# Altium footprint library MyPcb.PcbLib: 367 footprints (part 23 of 23)
Each footprint in its own frame and in the unit in brackets; x right, y up, seen from the top. Pads: shape width x height; smd on the part's side, far side on the other; paste and mask are expansions set on the pad; w line width, h text height; cw(c..) or ccw(c..) is an arc to the next point about the centre after c.
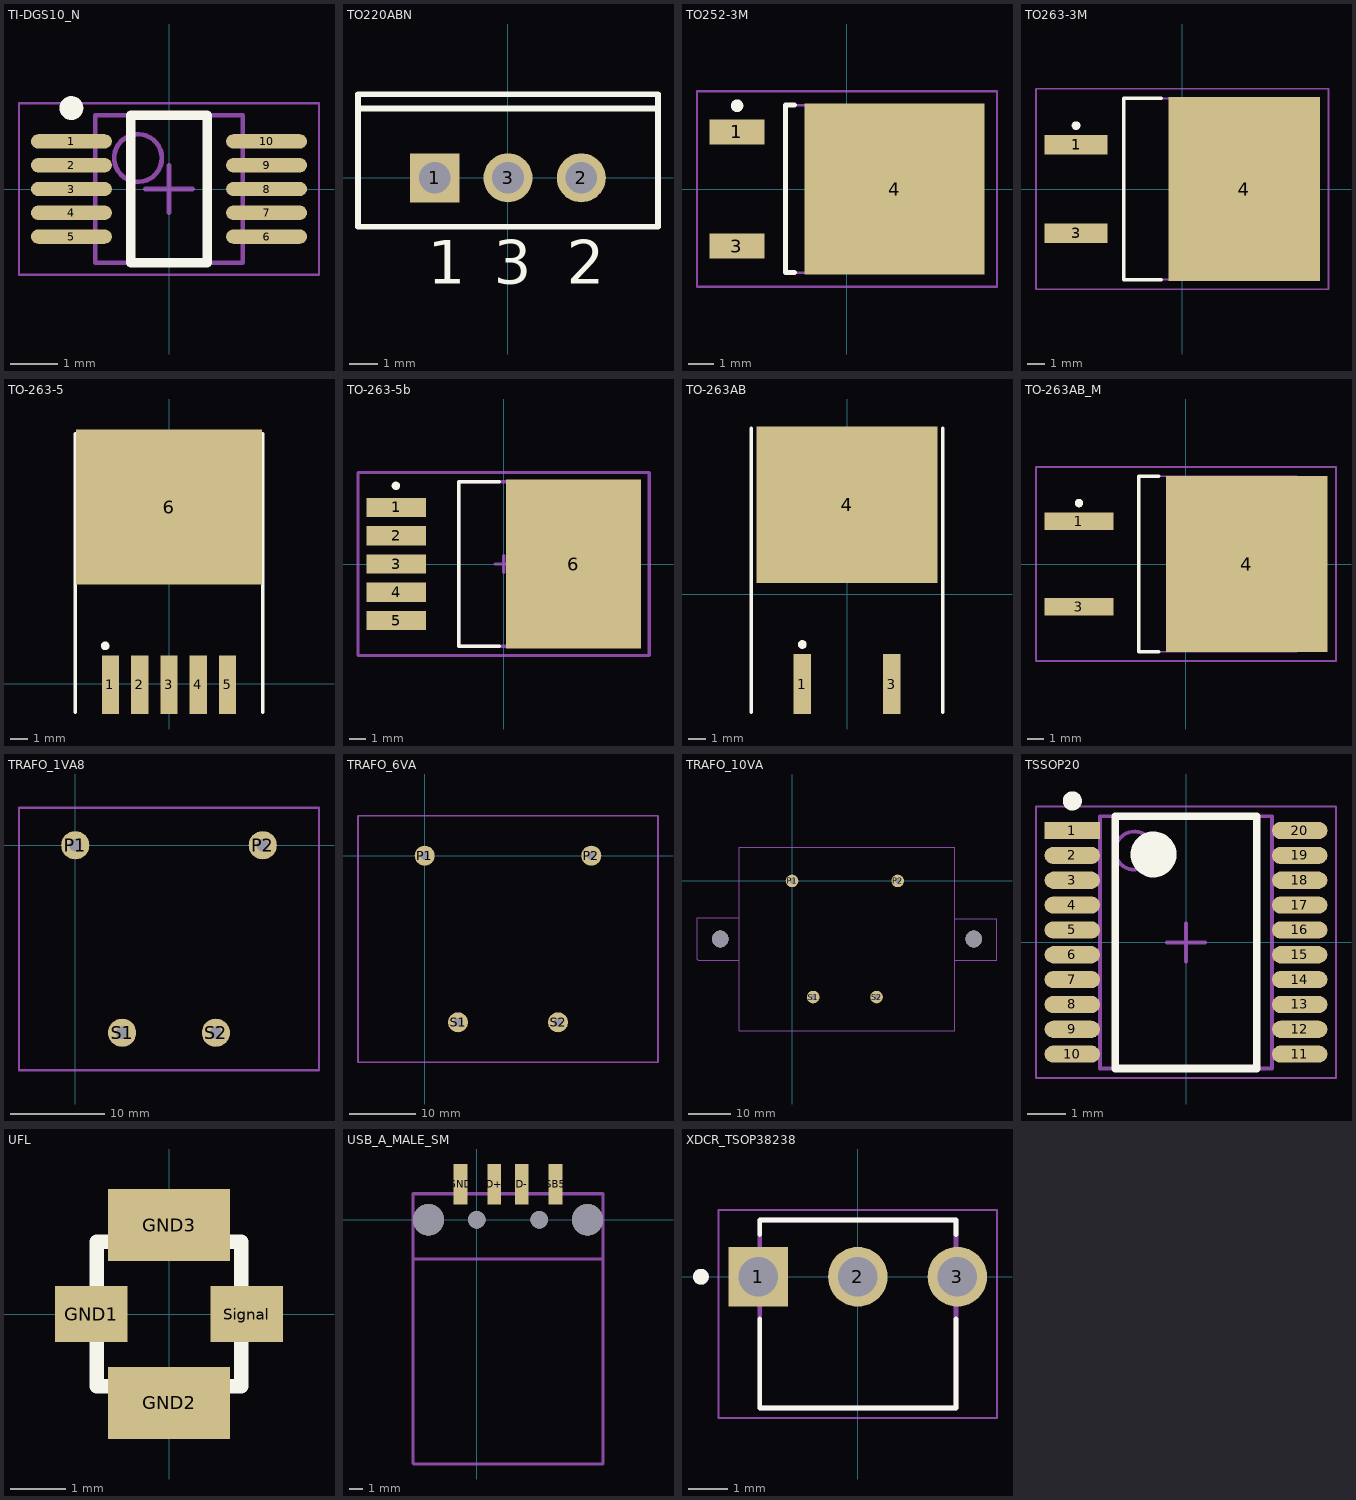
[diagram p22: the footprints below, top view; thin cyan lines are the x and y axes]

## TI-DGS10_N [mm] "SOP, 10-Leads, Body 3x3mm, Pitch 0.5mm, IPC Medium Density"
height 1.1
pads (10):
  oval 1.7x0.3 smd: 1(-2.05,1) 2(-2.05,0.5) 3(-2.05,0) 4(-2.05,-0.5) 5(-2.05,-1) 6(2.05,-1) 7(2.05,-0.5) 8(2.05,0) 9(2.05,0.5) 10(2.05,1)
Top Overlay:
  circle w0.25: c-2.05,1.7 r0.125
  lines w0.2: -0.8,-1.55 0.8,-1.55 0.8,1.55 -0.8,1.55 -0.8,-1.55
Mechanical 13:
  circle w0.1: c-0.65,0.65 r0.5
  lines w0.1: -1.55,-1.55 1.55,-1.55 1.55,1.55 -1.55,1.55 -1.55,-1.55
Mechanical 15:
  lines w0.05: -3.15,-1.8 3.15,-1.8 3.15,1.8 -3.15,1.8 -3.15,-1.8
  lines w0.1: -0.5,0 0.5,0 ; 0,-0.5 0,0.5
3D body: height 1.1, standoff 0.05, extent -1.55,-1.55 1.55,1.55

## TO220ABN [mm] "TO, Thru-Hole, Vertical, Heatsink Mounted; 3 In-Line Leads; Pitch 2.54 mm; Pin sequence 1, 3, 2"
height 19.7
pads (3):
  rect 1.7x1.7 hole 1.1: 1(-2.54,0)
  round 1.7 hole 1.1: 2(2.54,0) 3(0,0)
Top Overlay:
  lines w0.2: -5.2,2.4 5.2,2.4 ; -5.2,-1.7 5.2,-1.7 5.2,2.9 -5.2,2.9 -5.2,-1.7
  text "3" at -0.5,-3.675 h1.5
  text "2" at 2.04,-3.675 h1.5
  text "1" at -2.79,-3.675 h1.5

## TO252-3M [mm] "D-PAK, 4-Leads, Body 6.1x6.5mm, Pitch 2.28mm, Lead Span 9.7mm, IPC Low Density"
height 2.38
pads (3):
  rect 2.2x1 smd: 1(-4.4,2.28) 3(-4.4,-2.28)
  rect 7.2x6.85 smd: 4(1.9,0)
Top Overlay:
  circle w0.25: c-4.4,3.33 r0.125
  lines w0.2: -2.1,-3.35 -2.45,-3.35 -2.45,3.35 -2.1,3.35
Mechanical 13:
  lines w0.1: -2.45,-3.35 3.75,-3.35 3.75,3.35 -2.45,3.35 -2.45,-3.35
Mechanical 15:
  lines w0.1: -0.5,0 0.5,0 ; 0,-0.5 0,0.5 ; -6,-3.9 6,-3.9 6,3.9 -6,3.9 -6,-3.9
3D body: height 2.38, standoff 0, extent -2.45,-3.35 3.75,3.35

## TO263-3M [mm] "D2-PAK, 4-Leads, Body 9.4x10.2mm, Pitch 2.54mm, Lead Span 14.3mm, IPC Low Density"
height 4.65
pads (3):
  rect 3.6x1.1 smd: 1(-6.1,2.54) 3(-6.1,-2.54)
  rect 8.7x10.55 smd: 4(3.55,0)
Top Overlay:
  circle w0.25: c-6.1,3.64 r0.125
  lines w0.2: -1.2,-5.2 -3.35,-5.2 -3.35,5.2 -1.2,5.2
Mechanical 13:
  lines w0.1: -3.35,-5.2 -3.35,5.2 6.05,5.2 6.05,-5.2 -3.35,-5.2
Mechanical 15:
  lines w0.1: -0.5,0 0.5,0 ; 0,-0.5 0,0.5 ; -8.4,-5.75 -8.4,5.75 8.4,5.75 8.4,-5.75 -8.4,-5.75
3D body: height 4.65, standoff 0, extent -3.35,-5.2 6.05,5.2

## TO-263-5 [mm] "D2-PAK/TO-263-AB; 3 Leads (1 Cropped); Body 15.6 (inc. leads) x 10.3 mm (LxW max)"
height 4.57
pads (6):
  rect 1x3.4 smd: 1(-3.4,-0.05) 2(-1.7,-0.05) 3(0,-0.05) 4(1.7,-0.05) 5(3.4,-0.05)
  rect 10.8x9 smd: 6(0,10.25)
Top Overlay:
  circle w0.25: c-3.7,2.2 r0.125
  lines w0.2: -5.45,-1.65 -5.45,14.5 ; 5.45,-1.65 5.45,14.5

## TO-263-5b [mm] "D2-PAK, 6-Pads, Body 8,9x9,9mm (max), IPC Low Density"
height 4.65
pads (6):
  rect 3.6x1.15 smd: 1(-6.45,3.4) 2(-6.45,1.7) 3(-6.45,0) 4(-6.45,-1.7) 5(-6.45,-3.4)
  rect 8.1x10.15 smd paste-5: 6(4.2,0)
Top Overlay:
  circle w0.25: c-6.475,4.699 r0.125
  lines w0.2: -0.25,-4.95 -2.7,-4.95 -2.7,4.95 -0.25,4.95
Top Paste:
  rectangle: 0.254,3.683 2.159,4.953
  rectangle: 6.223,3.683 8.128,4.953
  rectangle: 2.667,3.683 5.715,4.953
  rectangle: 2.667,1.956 5.715,3.226
  rectangle: 6.223,1.956 8.128,3.226
  rectangle: 0.254,1.956 2.159,3.226
  rectangle: 2.667,0.229 5.715,1.499
  rectangle: 6.223,0.229 8.128,1.499
  rectangle: 0.254,0.229 2.159,1.499
  rectangle: 2.667,-1.499 5.715,-0.229
  rectangle: 6.223,-1.499 8.128,-0.229
  rectangle: 0.254,-1.499 2.159,-0.229
  rectangle: 2.667,-4.953 5.715,-3.683
  rectangle: 6.223,-4.953 8.128,-3.683
  rectangle: 0.254,-4.953 2.159,-3.683
  rectangle: 2.667,-3.226 5.715,-1.956
  rectangle: 6.223,-3.226 8.128,-1.956
  rectangle: 0.254,-3.226 2.159,-1.956
Mechanical 13:
  lines w0.2: -2.7,-4.95 6.19,-4.95 6.19,4.95 -2.7,4.95 -2.7,-4.95
  text ".Designator" at -2.032,2.286 h1.5
Mechanical 15:
  lines w0.2: -0.5,0 0.5,0 ; 0,-0.5 0,0.5 ; -8.75,-5.5 8.75,-5.5 8.75,5.5 -8.75,5.5 -8.75,-5.5
3D body "TO-263 5Ld.step": height 4.57, standoff -0.01, extent -7.308,-5.08 7.333,5.08

## TO-263AB [mm] "D2-PAK/TO-263-AB; 3 Leads (1 Cropped); Body 15.6 (inc. leads) x 10.3 mm (LxW max)"
height 4.57
pads (3):
  rect 1x3.4 smd: 1(-2.54,-5.1) 3(2.54,-5.1)
  rect 10.3x8.9 smd: 4(0,5.1)
Top Overlay:
  circle w0.25: c-2.54,-2.85 r0.125
  lines w0.2: -5.45,-6.7 -5.45,9.45 ; 5.45,-6.7 5.45,9.45

## TO-263AB_M [mm] "D2-PAK, 4-Leads, Body 9.3x10.2mm, Pitch 2.54mm, Lead Span 15.2mm, IPC Low Density"
height 4.57
pads (3):
  rect 4.1x1.05 smd: 1(-6.35,2.54) 3(-6.35,-2.54)
  rect 9.6x10.45 smd: 4(3.6,0)
Top Overlay:
  circle w0.25: c-6.35,3.615 r0.125
  lines w0.2: -1.6,-5.2 -2.8,-5.2 -2.8,5.2 -1.6,5.2
Mechanical 13:
  lines w0.1: -2.8,-5.2 -2.8,5.2 6.6,5.2 6.6,-5.2 -2.8,-5.2
Mechanical 15:
  lines w0.1: -0.5,0 0.5,0 ; 0,-0.5 0,0.5 ; -8.9,-5.75 -8.9,5.75 8.9,5.75 8.9,-5.75 -8.9,-5.75
3D body: height 4.57, standoff 0, extent -2.8,-5.2 6.6,5.2

## TRAFO_1VA8 [mm]
height 24
pads (4):
  round 3 hole 1.3: P1(0,0) P2(20,0) S1(5,-20) S2(15,-20)
Mechanical 1:
  lines w0.254: -6,-24 -6,4 26,4 26,-24 -6,-24

## TRAFO_6VA [mm]
height 34
pads (4):
  round 3 hole 1.3: P1(0,0) P2(25,0) S1(5,-25) S2(20,-25)
Mechanical 1:
  lines w0.254: -10,-31 35,-31 35,6 -10,6 -10,-31

## TRAFO_10VA [mm]
height 34
pads (4):
  round 3 hole 1.3: P1(0,0) P2(25,0) S1(5,-27.5) S2(20,-27.5)
via 43,-13.75 diameter 4 hole 4
via -17,-13.75 diameter 4 hole 4
Mechanical 1:
  lines w0.254: -12.5,-18.75 -17,-18.75 -22.25,-18.75 -22.5,-18.5 -22.5,-8.75 -16.75,-8.75 -12.5,-8.75 ; 38.5,-18.75 48.5,-18.75 48.5,-9 43,-9 38.5,-9 ; -12.5,-35.5 38.5,-35.5 38.5,8 -12.5,8 -12.5,-35.5

## TSSOP20 [mm] "TSSOP, 20-Leads, Body 6,50x4,40mm, Pitch 0,65mm, IPC Medium Density"
height 1.2
pads (20):
  rect 1.45x0.45 smd: 1(-2.975,2.925)
  oval 1.45x0.45 smd: 2(-2.975,2.275) 3(-2.975,1.625) 4(-2.975,0.975) 5(-2.975,0.325) 6(-2.975,-0.325) 7(-2.975,-0.975) 8(-2.975,-1.625) 9(-2.975,-2.275) 10(-2.975,-2.925) 11(2.975,-2.925) 12(2.975,-2.275) 13(2.975,-1.625) 14(2.975,-0.975) 15(2.975,-0.325) 16(2.975,0.325) 17(2.975,0.975) 18(2.975,1.625) 19(2.975,2.275) 20(2.975,2.925)
Top Overlay:
  circle w0.25: c-2.975,3.7 r0.125
  circle w0.6: c-0.85,2.3 r0.3
  lines w0.2: -1.85,-3.3 -1.85,3.3 1.85,3.3 1.85,-3.3 -1.85,-3.3
Mechanical 13:
  circle w0.1: c-1.35,2.4 r0.5
  lines w0.1: -2.25,-3.3 -2.25,3.3 2.25,3.3 2.25,-3.3 -2.25,-3.3
Mechanical 15:
  lines w0.05: -3.925,-3.55 -3.925,3.55 3.925,3.55 3.925,-3.55 -3.925,-3.55
  lines w0.1: -0.5,0 0.5,0 ; 0,-0.5 0,0.5
3D body "SW3dPS-TSSOP20.STEP": height 1.09, standoff 0, extent -3.036,-3.354 3.244,3.146

## UFL [mm]
pads (4):
  rect 1.3x1 smd: GND1(-1.4,0) Signal(1.4,0)
  rect 2.2x1.3 smd: GND2(0,-1.6) GND3(0,1.6)
Top Overlay:
  lines w0.254: -1.3,-1.3 -1.3,1.3 1.3,1.3 1.3,-1.3 -1.3,-1.3

## USB_A_MALE_SM [mm]
pads (4):
  rect 1x3 smd: D+(1.3,2.6) D-(3.3,2.6) GND(-1.2,2.6) USB5V(5.8,2.6)
via 8.15,0 diameter 2.3 hole 2.3
via 4.6,0 diameter 1.3 hole 1.3
via 0,0 diameter 1.3 hole 1.3
via -3.55,0 diameter 2.3 hole 2.3
Mechanical 1:
  lines w0.254: -4.7,0 -4.7,-17.9 -4.6,-18 9.3,-18 9.3,0 ; -4.7,-2.9 -4.7,1.9 9.3,1.9 9.3,-2.9 -4.7,-2.9
3D body: height 3.2, standoff -1.3, extent -4.064,-17.145 8.636,1.905

## XDCR_TSOP38238 [mm]
pads (3):
  rect 1.518x1.518 hole 1.01: 1(-2.54,0)
  round 1.518 hole 1.01: 2(0,0) 3(2.54,0)
Top Overlay:
  circle w0.2: c-4,0 r0.1
  lines w0.127: -2.5,-1.08 -2.5,-3.35 2.5,-3.35 2.5,-1.08 ; -2.5,1.08 -2.5,1.45 2.5,1.45 2.5,1.08
Mechanical 13:
  circle w0.2: c-4,0 r0.1
  lines w0.127: -2.5,-3.35 -2.5,1.45 2.5,1.45 2.5,-3.35 -2.5,-3.35
Mechanical 15:
  lines w0.05: -3.55,-3.6 -3.55,1.7 3.55,1.7 3.55,-3.6 -3.55,-3.6